# Altium footprint library ICs And Semiconductors SMD.PcbLib: 943 footprints (part 6 of 60) (continued)
## HAMAMATSU_S12642-050CN(X) [mm] "MPPC (Multi-Pixel Photon Counter), Body 13.1 x 13.1x 6.55mm"
height 6.55
Top Overlay:
  lines w0.2: -6.55,-6.55 -6.55,6.55 6.55,6.55 6.55,-6.55 -6.55,-6.55
  text "A" at -5.3,7.225 h1.2
  text "1" at -7.775,4.3 h1.2
  text "4" at -7.975,-5.3 h1.2
  text "D" at 4.3,7.225 h1.2
  text "B" at -2.1,7.225 h1.2
  text "C" at 1.1,7.225 h1.2
  text "2" at -7.975,1.1 h1.2
  text "3" at -7.975,-2.1 h1.2
Mechanical 8:
  lines w0.1: -0.5,0 0,0 ; 0,-0.5 0,0 ; 0,0.5 0,0 ; 0.5,0 0,0
Mechanical 14:
  lines w0.1: -6.55,-6.55 -6.55,6.55 6.55,6.55 6.55,-6.55 -6.55,-6.55 ; -6.3,-6.3 -6.3,-3.3 -3.3,-3.3 -3.3,-6.3 -6.3,-6.3 ; -6.3,-3.1 -6.3,-0.1 -3.3,-0.1 -3.3,-3.1 -6.3,-3.1 ; -6.3,0.1 -6.3,3.1 -3.3,3.1 -3.3,0.1 -6.3,0.1 ; -6.3,3.3 -6.3,6.3 -3.3,6.3 -3.3,3.3 -6.3,3.3 ; -3.1,-6.3 -3.1,-3.3 -0.1,-3.3 -0.1,-6.3 -3.1,-6.3 ; -3.1,-3.1 -3.1,-0.1 -0.1,-0.1 -0.1,-3.1 -3.1,-3.1 ; -3.1,0.1 -3.1,3.1 -0.1,3.1 -0.1,0.1 -3.1,0.1 ; -3.1,3.3 -3.1,6.3 -0.1,6.3 -0.1,3.3 -3.1,3.3 ; 0.1,-6.3 0.1,-3.3 3.1,-3.3 3.1,-6.3 0.1,-6.3 ; 0.1,-3.1 0.1,-0.1 3.1,-0.1 3.1,-3.1 0.1,-3.1 ; 0.1,0.1 0.1,3.1 3.1,3.1 3.1,0.1 0.1,0.1 ; 0.1,3.3 0.1,6.3 3.1,6.3 3.1,3.3 0.1,3.3 ; 3.3,-6.3 3.3,-3.3 6.3,-3.3 6.3,-6.3 3.3,-6.3 ; 3.3,-3.1 3.3,-0.1 6.3,-0.1 6.3,-3.1 3.3,-3.1 ; 3.3,0.1 3.3,3.1 6.3,3.1 6.3,0.1 3.3,0.1 ; 3.3,3.3 3.3,6.3 6.3,6.3 6.3,3.3 3.3,3.3
  text "A-1" at -5.85,4.4 h0.8
  text "B-1" at -2.65,4.4 h0.8
  text "C-1" at 0.55,4.4 h0.8
  text "D-1" at 3.75,4.4 h0.8
  text "D-2" at 3.75,1.2 h0.8
  text "C-2" at 0.55,1.2 h0.8
  text "B-2" at -2.65,1.2 h0.8
  text "A-2" at -5.85,1.2 h0.8
  text "D-3" at 3.75,-2 h0.8
  text "C-3" at 0.55,-2 h0.8
  text "B-3" at -2.65,-2 h0.8
  text "A-3" at -5.85,-2 h0.8
  text "D-4" at 3.75,-5.2 h0.8
  text "C-4" at 0.55,-5.2 h0.8
  text "B-4" at -2.65,-5.2 h0.8
  text "A-4" at -5.85,-5.2 h0.8
3D body "HAMAMATSU_S12642-050CN(X)_Part2.stp": height 5.65, standoff 5.05, extent -6.55,-6.55 6.55,6.55
3D body "HAMAMATSU_S12642-050CN(X)_Part1.stp": height 5.35, standoff 0.92, extent -6.55,-6.55 6.55,6.55

## HAMAMATSU_S12642-0404PA-50 [mm] "3x3mm2, 16 Channel (4x4) TSV MPPC (Multi-Pixel Photon Counter), Body 13.1 x 13.1x 1.55mm"
height 1.55
pads (32):
  round 0.7 smd: AA1(-4.15,4.15) AA2(-4.15,0.95) AA3(-4.15,-2.25) AA4(-4.15,-5.45) AB1(-0.95,4.15) AB2(-0.95,0.95) AB3(-0.95,-2.25) AB4(-0.95,-5.45) AC1(2.25,5.45) AC2(2.25,2.25) AC3(2.25,-0.95) AC4(2.25,-4.15) AD1(5.45,5.45) AD2(5.45,2.25) AD3(5.45,-0.95) AD4(5.45,-4.15) KA1(-5.45,5.45) KA2(-5.45,2.25) KA3(-5.45,-0.95) KA4(-5.45,-4.15) KB1(-2.25,5.45) KB2(-2.25,2.25) KB3(-2.25,-0.95) KB4(-2.25,-4.15) KC1(0.95,4.15) KC2(0.95,0.95) KC3(0.95,-2.25) KC4(0.95,-5.45) KD1(4.15,4.15) KD2(4.15,0.95) KD3(4.15,-2.25) KD4(4.15,-5.45)
Top Overlay:
  lines w0.2: -6.55,-6.55 -6.55,6.55 6.55,6.55 6.55,-6.55 -6.55,-6.55 ; 5.3,-6.3 6.3,-5.3 6.3,-6.3 5.3,-6.3
  text "A" at -5.3,7.225 h1.2
  text "1" at -7.775,4.3 h1.2
  text "4" at -7.975,-5.3 h1.2
  text "D" at 4.3,7.225 h1.2
  text "B" at -2.1,7.225 h1.2
  text "C" at 1.1,7.225 h1.2
  text "2" at -7.975,1.1 h1.2
  text "3" at -7.975,-2.1 h1.2
Mechanical 8:
  lines w0.1: -5.95,-4.15 -5.45,-4.15 ; -5.95,-0.95 -5.45,-0.95 ; -5.95,2.25 -5.45,2.25 ; -5.95,5.45 -5.45,5.45 ; -5.45,-4.65 -5.45,-4.15 ; -5.45,-3.65 -5.45,-4.15 ; -5.45,-1.45 -5.45,-0.95 ; -5.45,-0.45 -5.45,-0.95 ; -5.45,1.75 -5.45,2.25 ; -5.45,2.75 -5.45,2.25 ; -5.45,4.95 -5.45,5.45 ; -5.45,5.95 -5.45,5.45 ; -4.95,-4.15 -5.45,-4.15 ; -4.95,-0.95 -5.45,-0.95 ; -4.95,2.25 -5.45,2.25 ; -4.95,5.45 -5.45,5.45 ; -4.65,-5.45 -4.15,-5.45 ; -4.65,-2.25 -4.15,-2.25 ; -4.65,0.95 -4.15,0.95 ; -4.65,4.15 -4.15,4.15 ; -4.15,-5.95 -4.15,-5.45 ; -4.15,-4.95 -4.15,-5.45 ; -4.15,-2.75 -4.15,-2.25 ; -4.15,-1.75 -4.15,-2.25 ; -4.15,0.45 -4.15,0.95 ; -4.15,1.45 -4.15,0.95 ; -4.15,3.65 -4.15,4.15 ; -4.15,4.65 -4.15,4.15 ; -3.65,-5.45 -4.15,-5.45 ; -3.65,-2.25 -4.15,-2.25 ; -3.65,0.95 -4.15,0.95 ; -3.65,4.15 -4.15,4.15 ; -2.75,-4.15 -2.25,-4.15 ; -2.75,-0.95 -2.25,-0.95 ; -2.75,2.25 -2.25,2.25 ; -2.75,5.45 -2.25,5.45 ; -2.25,-4.65 -2.25,-4.15 ; -2.25,-3.65 -2.25,-4.15 ; -2.25,-1.45 -2.25,-0.95 ; -2.25,-0.45 -2.25,-0.95 ; -2.25,1.75 -2.25,2.25 ; -2.25,2.75 -2.25,2.25 ; -2.25,4.95 -2.25,5.45 ; -2.25,5.95 -2.25,5.45 ; -1.75,-4.15 -2.25,-4.15 ; -1.75,-0.95 -2.25,-0.95 ; -1.75,2.25 -2.25,2.25 ; -1.75,5.45 -2.25,5.45 ; -1.45,-5.45 -0.95,-5.45 ; -1.45,-2.25 -0.95,-2.25 ; -1.45,0.95 -0.95,0.95 ; -1.45,4.15 -0.95,4.15 ; -0.95,-5.95 -0.95,-5.45 ; -0.95,-4.95 -0.95,-5.45 ; -0.95,-2.75 -0.95,-2.25 ; -0.95,-1.75 -0.95,-2.25 ; -0.95,0.45 -0.95,0.95 ; -0.95,1.45 -0.95,0.95 ; -0.95,3.65 -0.95,4.15 ; -0.95,4.65 -0.95,4.15 ; -0.5,0 0,0 ; -0.45,-5.45 -0.95,-5.45 ; -0.45,-2.25 -0.95,-2.25 ; -0.45,0.95 -0.95,0.95 ; -0.45,4.15 -0.95,4.15 ; 0,-0.5 0,0 ; 0,0.5 0,0 ; 0.45,-5.45 0.95,-5.45 ; 0.45,-2.25 0.95,-2.25 ; 0.45,0.95 0.95,0.95 ; 0.45,4.15 0.95,4.15 ; 0.5,0 0,0 ; 0.95,-5.95 0.95,-5.45 ; 0.95,-4.95 0.95,-5.45 ; 0.95,-2.75 0.95,-2.25 ; 0.95,-1.75 0.95,-2.25 ; 0.95,0.45 0.95,0.95 ; 0.95,1.45 0.95,0.95 ; 0.95,3.65 0.95,4.15 ; 0.95,4.65 0.95,4.15 ; 1.45,-5.45 0.95,-5.45 ; 1.45,-2.25 0.95,-2.25 ; 1.45,0.95 0.95,0.95 ; 1.45,4.15 0.95,4.15 ; 1.75,-4.15 2.25,-4.15 ; 1.75,-0.95 2.25,-0.95 ; 1.75,2.25 2.25,2.25 ; 1.75,5.45 2.25,5.45 ; 2.25,-4.65 2.25,-4.15 ; 2.25,-3.65 2.25,-4.15 ; 2.25,-1.45 2.25,-0.95 ; 2.25,-0.45 2.25,-0.95 ; 2.25,1.75 2.25,2.25 ; 2.25,2.75 2.25,2.25 ; 2.25,4.95 2.25,5.45 ; 2.25,5.95 2.25,5.45 ; 2.75,-4.15 2.25,-4.15 ; 2.75,-0.95 2.25,-0.95 ; 2.75,2.25 2.25,2.25 ; 2.75,5.45 2.25,5.45 ; 3.65,-5.45 4.15,-5.45 ; 3.65,-2.25 4.15,-2.25 ; 3.65,0.95 4.15,0.95 ; 3.65,4.15 4.15,4.15 ; 4.15,-5.95 4.15,-5.45 ; 4.15,-4.95 4.15,-5.45 ; 4.15,-2.75 4.15,-2.25 ; 4.15,-1.75 4.15,-2.25 ; 4.15,0.45 4.15,0.95 ; 4.15,1.45 4.15,0.95 ; 4.15,3.65 4.15,4.15 ; 4.15,4.65 4.15,4.15 ; 4.65,-5.45 4.15,-5.45 ; 4.65,-2.25 4.15,-2.25 ; 4.65,0.95 4.15,0.95 ; 4.65,4.15 4.15,4.15 ; 4.95,-4.15 5.45,-4.15 ; 4.95,-0.95 5.45,-0.95 ; 4.95,2.25 5.45,2.25 ; 4.95,5.45 5.45,5.45 ; 5.45,-4.65 5.45,-4.15 ; 5.45,-3.65 5.45,-4.15 ; 5.45,-1.45 5.45,-0.95 ; 5.45,-0.45 5.45,-0.95 ; 5.45,1.75 5.45,2.25 ; 5.45,2.75 5.45,2.25 ; 5.45,4.95 5.45,5.45 ; 5.45,5.95 5.45,5.45 ; 5.95,-4.15 5.45,-4.15 ; 5.95,-0.95 5.45,-0.95 ; 5.95,2.25 5.45,2.25 ; 5.95,5.45 5.45,5.45
  text "K(B-3)" at -1.75,-0.95 h0.3
  text "A(B-3)" at -3.05,-2.25 h0.3
  text "K(B-2)" at -1.75,2.25 h0.3
  text "A(B-2)" at -3.05,0.95 h0.3
  text "K(C-3)" at 1.45,-2.25 h0.3
  text "A(C-3)" at 0.15,-0.95 h0.3
  text "K(C-2)" at 1.45,0.95 h0.3
  text "A(C-2)" at 0.15,2.25 h0.3
  text "K(B-1)" at -1.75,5.45 h0.3
  text "A(B-1)" at -3.05,4.15 h0.3
  text "K(B-4)" at -1.75,-4.15 h0.3
  text "A(B-4)" at -3.05,-5.45 h0.3
  text "K(C-4)" at 1.45,-5.45 h0.3
  text "A(C-4)" at 0.15,-4.15 h0.3
  text "K(C-1)" at 1.45,4.15 h0.3
  text "A(C-1)" at 0.15,5.45 h0.3
  text "K(D-4)" at 4.65,-5.45 h0.3
  text "A(D-4)" at 3.35,-4.15 h0.3
  text "K(D-3)" at 4.65,-2.25 h0.3
  text "A(D-3)" at 3.35,-0.95 h0.3
  text "K(A-4)" at -4.95,-4.15 h0.3
  text "A(A-4)" at -6.25,-5.45 h0.3
  text "K(A-3)" at -4.95,-0.95 h0.3
  text "A(A-3)" at -6.25,-2.25 h0.3
  text "K(A-2)" at -4.95,2.25 h0.3
  text "A(A-2)" at -6.25,0.95 h0.3
  text "K(D-2)" at 4.65,0.95 h0.3
  text "A(D-2)" at 3.35,2.25 h0.3
  text "K(A-1)" at -4.95,5.45 h0.3
  text "A(A-1)" at -6.25,4.15 h0.3
  text "K(D-1)" at 4.65,4.15 h0.3
  text "A(D-1)" at 3.35,5.45 h0.3
Mechanical 14:
  lines w0.1: -3.1,6.3 -0.1,6.3 ; 0.1,6.3 3.1,6.3 ; 6.3,-6.3 6.3,-5.3 5.3,-6.3 6.3,-6.3 ; 6.3,-6.3 3.3,-6.3 3.3,-3.3 6.3,-3.3 6.3,-6.3 ; -6.55,-6.55 -6.55,6.55 6.55,6.55 6.55,-6.55 -6.55,-6.55 ; -6.3,-6.3 -6.3,-3.3 -3.3,-3.3 -3.3,-6.3 -6.3,-6.3 ; -6.3,-3.1 -6.3,-0.1 -3.3,-0.1 -3.3,-3.1 -6.3,-3.1 ; -6.3,0.1 -6.3,3.1 -3.3,3.1 -3.3,0.1 -6.3,0.1 ; -6.3,3.3 -6.3,6.3 -3.3,6.3 -3.3,3.3 -6.3,3.3 ; -3.1,-6.3 -3.1,-3.3 -0.1,-3.3 -0.1,-6.3 -3.1,-6.3 ; -3.1,-3.1 -3.1,-0.1 -0.1,-0.1 -0.1,-3.1 -3.1,-3.1 ; -3.1,0.1 -3.1,3.1 -0.1,3.1 -0.1,0.1 -3.1,0.1 ; -3.1,3.3 -3.1,6.3 -0.1,6.3 -0.1,3.3 -3.1,3.3 ; 0.1,-6.3 0.1,-3.3 3.1,-3.3 3.1,-6.3 0.1,-6.3 ; 0.1,-3.1 0.1,-0.1 3.1,-0.1 3.1,-3.1 0.1,-3.1 ; 0.1,0.1 0.1,3.1 3.1,3.1 3.1,0.1 0.1,0.1 ; 0.1,3.3 0.1,6.3 3.1,6.3 3.1,3.3 0.1,3.3 ; 3.3,-3.1 3.3,-0.1 6.3,-0.1 6.3,-3.1 3.3,-3.1 ; 3.3,0.1 3.3,3.1 6.3,3.1 6.3,0.1 3.3,0.1 ; 3.3,3.3 3.3,6.3 6.3,6.3 6.3,3.3 3.3,3.3
3D body "HAMAMATSU_S12642-0404PA-50_Part1.stp": height 1.45, standoff 0, extent -6.55,-6.55 6.55,6.55
3D body "HAMAMATSU_S12642-0404PA-50_Part2.stp": height 1.55, standoff 1.15, extent -6.55,-6.55 6.55,6.55

## HAMAMATSU_S12642-0808PA-50 [mm] "3x3mm2, 64 Channel (8x8) TSV MPPC (Multi-Pixel Photon Counter), Body 25.8 x 25.8 x 1.55mm"
height 1.55
pads (128):
  round 0.7 smd: AA1(-10.55,10.55) AA2(-10.55,7.35) AA3(-10.55,4.15) AA4(-10.55,0.95) AA5(-10.55,-2.25) AA6(-10.55,-5.45) AA7(-10.55,-8.65) AA8(-10.55,-11.85) AB1(-7.35,10.55) AB2(-7.35,7.35) AB3(-7.35,4.15) AB4(-7.35,0.95) AB5(-7.35,-2.25) AB6(-7.35,-5.45) AB7(-7.35,-11.85) AB7(-7.35,-8.65) AC1(-4.15,11.85) AC2(-4.15,8.65) AC3(-4.15,5.45) AC4(-4.15,2.25) AC5(-4.15,-0.95) AC6(-4.15,-4.15) AC7(-4.15,-7.35) AC8(-4.15,-10.55) AD1(-0.95,11.85) AD2(-0.95,8.65) AD3(-0.95,5.45) AD4(-0.95,2.25) AD5(-0.95,-0.95) AD6(-0.95,-4.15) AD7(-0.95,-7.35) AD8(-0.95,-10.55) AE1(2.25,10.55) AE2(2.25,7.35) AE3(2.25,4.15) AE4(2.25,0.95) AE5(2.25,-2.25) AE6(2.25,-5.45) AE7(2.25,-8.65) AE8(2.25,-11.85) AF1(5.45,10.55) AF2(5.45,7.35) AF3(5.45,4.15) AF4(5.45,0.95) AF5(5.45,-2.25) AF6(5.45,-5.45) AF7(5.45,-8.65) AF8(5.45,-11.85) AG1(8.65,11.85) AG2(8.65,8.65) AG3(8.65,5.45) AG4(8.65,2.25) AG5(8.65,-0.95) AG6(8.65,-4.15) AG7(8.65,-7.35) AG8(8.65,-10.55) AH1(11.85,11.85) AH2(11.85,8.65) AH3(11.85,5.45) AH4(11.85,2.25) AH5(11.85,-0.95) AH6(11.85,-4.15) AH7(11.85,-7.35) AH8(11.85,-10.55) KA1(-11.85,11.85) KA2(-11.85,8.65) KA3(-11.85,5.45) KA4(-11.85,2.25) KA5(-11.85,-0.95) KA6(-11.85,-4.15) KA7(-11.85,-7.35) KA8(-11.85,-10.55) KB1(-8.65,11.85) KB2(-8.65,8.65) KB3(-8.65,5.45) KB4(-8.65,2.25) KB5(-8.65,-0.95) KB6(-8.65,-4.15) KB7(-8.65,-7.35) KB8(-8.65,-10.55) KC1(-5.45,10.55) KC2(-5.45,7.35) KC3(-5.45,4.15) KC4(-5.45,0.95) KC5(-5.45,-2.25) KC6(-5.45,-5.45) KC7(-5.45,-8.65) KC8(-5.45,-11.85) KD1(-2.25,10.55) KD2(-2.25,7.35) KD3(-2.25,4.15) KD4(-2.25,0.95) KD5(-2.25,-2.25) KD6(-2.25,-5.45) KD7(-2.25,-8.65) KD8(-2.25,-11.85) KE1(0.95,11.85) KE2(0.95,8.65) KE3(0.95,5.45) KE4(0.95,2.25) KE5(0.95,-0.95) KE6(0.95,-4.15) KE7(0.95,-7.35) KE8(0.95,-10.55) KF1(4.15,11.85) KF2(4.15,8.65) KF3(4.15,5.45) KF4(4.15,2.25) KF5(4.15,-0.95) KF6(4.15,-4.15) KF7(4.15,-7.35) KF8(4.15,-10.55) KG1(7.35,10.55) KG2(7.35,7.35) KG3(7.35,4.15) KG4(7.35,0.95) KG5(7.35,-2.25) KG6(7.35,-5.45) KG7(7.35,-8.65) KG8(7.35,-11.85) KH1(10.55,10.55) KH2(10.55,7.35) KH3(10.55,4.15) KH4(10.55,0.95) KH5(10.55,-2.25) KH6(10.55,-5.45) KH7(10.55,-8.65) KH8(10.55,-11.85)
Top Overlay:
  lines w0.2: 11.7,-12.7 12.7,-11.7 ; 11.7,-12.7 12.7,-12.7 ; 11.7,-12.7 12.7,-11.7 ; 11.7,-12.7 12.7,-12.7 ; 12.7,-12.7 12.7,-11.7 ; 12.7,-12.7 12.7,-11.7 ; -12.9,-12.9 12.9,-12.9 12.9,12.9 -12.9,12.9 -12.9,-12.9
  text "7" at -14.325,-8.6 h1.2
  text "6" at -14.325,-5.4 h1.2
  text "3" at -14.325,4.2 h1.2
  text "2" at -14.325,7.4 h1.2
  text "G" at 7.601,13.45 h1.2
  text "F" at 4.43,13.45 h1.2
  text "E" at 1.23,13.45 h1.2
  text "D" at -2.064,13.45 h1.2
  text "C" at -5.142,13.45 h1.2
  text "B" at -8.43,13.45 h1.2
  text "H" at 10.77,13.45 h1.2
  text "A" at -11.69,13.45 h1.2
  text "4" at -14.325,1 h1.2
  text "1" at -14.15,10.6 h1.2
  text "8" at -14.325,-11.8 h1.2
  text "5" at -14.325,-2.2 h1.2
Mechanical 8:
  drawing of 534 lines, arcs and shapes, not listed
  text "K(F-7)" at 4.475,-7.075 h0.3
  text "A(F-7)" at 3.68,-8.375 h0.3
  text "K(F-6)" at 4.475,-3.875 h0.3
  text "A(F-6)" at 3.68,-5.175 h0.3
  text "K(G-7)" at 7.675,-8.395 h0.3
  text "A(G-7)" at 6.85,-7.095 h0.3
  text "K(G-6)" at 7.675,-5.195 h0.3
  text "A(G-6)" at 6.85,-3.895 h0.3
  text "K(F-5)" at 4.475,-0.675 h0.3
  text "A(F-5)" at 3.68,-1.975 h0.3
  text "K(F-8)" at 4.475,-10.275 h0.3
  text "A(F-8)" at 3.68,-11.575 h0.3
  text "K(G-8)" at 7.675,-11.575 h0.3
  text "A(G-8)" at 6.85,-10.275 h0.3
  text "K(G-5)" at 7.675,-1.975 h0.3
  text "A(G-5)" at 6.85,-0.675 h0.3
  text "K(H-8)" at 10.875,-11.575 h0.3
  text "A(H-8)" at 10.05,-10.275 h0.3
  text "K(H-7)" at 10.875,-8.375 h0.3
  text "A(H-7)" at 10.05,-7.075 h0.3
  text "K(E-8)" at 1.275,-10.275 h0.3
  text "A(E-8)" at 0.48,-11.575 h0.3
  text "K(E-7)" at 1.275,-7.075 h0.3
  text "A(E-7)" at 0.48,-8.375 h0.3
  text "K(E-6)" at 1.275,-3.875 h0.3
  text "A(E-6)" at 0.48,-5.175 h0.3
  text "K(H-6)" at 10.875,-5.175 h0.3
  text "A(H-6)" at 10.05,-3.875 h0.3
  text "K(E-5)" at 1.275,-0.675 h0.3
  text "A(E-5)" at 0.48,-1.975 h0.3
  text "K(H-5)" at 10.875,-1.975 h0.3
  text "A(H-5)" at 10.05,-0.675 h0.3
  text "K(F-3)" at 4.475,5.725 h0.3
  text "A(F-3)" at 3.68,4.425 h0.3
  text "K(F-2)" at 4.475,8.925 h0.3
  text "A(F-2)" at 3.68,7.625 h0.3
  text "K(G-3)" at 7.675,4.405 h0.3
  text "A(G-3)" at 6.85,5.705 h0.3
  text "K(G-2)" at 7.675,7.605 h0.3
  text "A(G-2)" at 6.85,8.905 h0.3
  text "K(F-1)" at 4.475,12.125 h0.3
  text "A(F-1)" at 3.74,10.825 h0.3
  text "K(F-4)" at 4.475,2.525 h0.3
  text "A(F-4)" at 3.65,1.225 h0.3
  text "K(G-4)" at 7.675,1.225 h0.3
  text "A(G-4)" at 6.82,2.525 h0.3
  text "K(G-1)" at 7.675,10.825 h0.3
  text "A(G-1)" at 6.91,12.125 h0.3
  text "K(H-4)" at 10.875,1.225 h0.3
  text "A(H-4)" at 10.02,2.525 h0.3
  text "K(H-3)" at 10.875,4.425 h0.3
  text "A(H-3)" at 10.05,5.725 h0.3
  text "K(E-4)" at 1.275,2.525 h0.3
  text "A(E-4)" at 0.45,1.225 h0.3
  text "K(E-3)" at 1.275,5.725 h0.3
  text "A(E-3)" at 0.48,4.425 h0.3
  text "K(E-2)" at 1.275,8.925 h0.3
  text "A(E-2)" at 0.48,7.625 h0.3
  text "K(H-2)" at 10.875,7.625 h0.3
  text "A(H-2)" at 10.05,8.925 h0.3
  text "K(E-1)" at 1.275,12.125 h0.3
  text "A(E-1)" at 0.54,10.825 h0.3
  text "K(H-1)" at 10.875,10.825 h0.3
  text "A(H-1)" at 10.11,12.125 h0.3
  text "K(B-3)" at -8.325,5.725 h0.3
  text "A(B-3)" at -9.15,4.425 h0.3
  text "K(B-2)" at -8.325,8.925 h0.3
  text "A(B-2)" at -9.15,7.625 h0.3
  text "K(C-3)" at -5.125,4.405 h0.3
  text "A(C-3)" at -5.92,5.705 h0.3
  text "K(C-2)" at -5.125,7.605 h0.3
  text "A(C-2)" at -5.92,8.905 h0.3
  text "K(B-1)" at -8.325,12.125 h0.3
  text "A(B-1)" at -9.09,10.825 h0.3
  text "K(B-4)" at -8.325,2.525 h0.3
  text "A(B-4)" at -9.18,1.225 h0.3
  text "K(C-4)" at -5.125,1.225 h0.3
  text "A(C-4)" at -5.95,2.525 h0.3
  text "K(C-1)" at -5.125,10.825 h0.3
  text "A(C-1)" at -5.86,12.125 h0.3
  text "K(D-4)" at -1.925,1.225 h0.3
  text "A(D-4)" at -2.78,2.525 h0.3
  text "K(D-3)" at -1.925,4.425 h0.3
  text "A(D-3)" at -2.75,5.725 h0.3
  text "K(A-4)" at -11.525,2.525 h0.3
  text "A(A-4)" at -12.41,1.225 h0.3
  text "K(A-3)" at -11.525,5.725 h0.3
  text "A(A-3)" at -12.38,4.425 h0.3
  text "K(A-2)" at -11.525,8.925 h0.3
  text "A(A-2)" at -12.38,7.625 h0.3
  text "K(D-2)" at -1.925,7.625 h0.3
  text "A(D-2)" at -2.75,8.925 h0.3
  text "K(A-1)" at -11.525,12.125 h0.3
  text "A(A-1)" at -12.32,10.825 h0.3
  text "K(D-1)" at -1.925,10.825 h0.3
  text "A(D-1)" at -2.69,12.125 h0.3
  text "K(B-7)" at -8.325,-7.075 h0.3
  text "A(B-7)" at -9.15,-8.375 h0.3
  text "K(B-6)" at -8.325,-3.875 h0.3
  text "A(B-6)" at -9.15,-5.175 h0.3
  text "K(C-7)" at -5.125,-8.395 h0.3
  text "A(C-7)" at -5.92,-7.095 h0.3
  text "K(C-6)" at -5.125,-5.195 h0.3
  text "A(C-6)" at -5.92,-3.895 h0.3
  text "K(B-5)" at -8.325,-0.675 h0.3
  text "A(B-5)" at -9.15,-1.975 h0.3
  text "K(B-8)" at -8.325,-10.275 h0.3
  text "A(B-8)" at -9.15,-11.575 h0.3
  text "K(C-8)" at -5.125,-11.575 h0.3
  text "A(C-8)" at -5.92,-10.275 h0.3
  text "K(C-5)" at -5.125,-1.975 h0.3
  text "A(C-5)" at -5.92,-0.675 h0.3
  text "K(D-8)" at -1.925,-11.575 h0.3
  text "A(D-8)" at -2.75,-10.275 h0.3
  text "K(D-7)" at -1.925,-8.375 h0.3
  text "A(D-7)" at -2.75,-7.075 h0.3
  text "K(A-8)" at -11.525,-10.275 h0.3
  text "A(A-8)" at -12.38,-11.575 h0.3
  text "K(A-7)" at -11.525,-7.075 h0.3
  text "A(A-7)" at -12.38,-8.375 h0.3
  text "K(A-6)" at -11.525,-3.875 h0.3
  text "A(A-6)" at -12.38,-5.175 h0.3
  text "K(D-6)" at -1.925,-5.175 h0.3
  text "A(D-6)" at -2.75,-3.875 h0.3
  text "K(A-5)" at -11.525,-0.675 h0.3
  text "A(A-5)" at -12.38,-1.975 h0.3
  text "K(D-5)" at -1.925,-1.975 h0.3
  text "A(D-5)" at -2.75,-0.675 h0.3
Mechanical 14:
  drawing of 264 lines, arcs and shapes, not listed
  text "7" at -14.325,-8.6 h1.2
  text "6" at -14.325,-5.4 h1.2
  text "3" at -14.325,4.2 h1.2
  text "2" at -14.325,7.4 h1.2
  text "G" at 7.601,13.45 h1.2
  text "F" at 4.43,13.45 h1.2
  text "E" at 1.23,13.45 h1.2
  text "D" at -2.064,13.45 h1.2
  text "C" at -5.142,13.45 h1.2
  text "B" at -8.43,13.45 h1.2
  text "H" at 10.77,13.45 h1.2
  text "A" at -11.69,13.45 h1.2
  text "4" at -14.325,1 h1.2
  text "1" at -14.15,10.6 h1.2
  text "8" at -14.325,-11.8 h1.2
  text "5" at -14.325,-2.2 h1.2
3D body "HAMAMATSU_S12642-0808PA-50_Part2.stp": height 1.55, standoff 1.15, extent -12.9,-12.9 12.9,12.9
3D body "HAMAMATSU_S12642-0808PA-50_Part1.stp": height 1.45, standoff 0, extent -12.9,-12.9 12.9,12.9

## HAMAMATSU_S12642-0808PB-50 [mm] "3x3mm2, 64 Channel (8x8) TSV MPPC (Multi-Pixel Photon Counter), Body 25.8 x 25.8 x 1.45mm"
height 5.45
Top Overlay:
  lines w0.2: -12.9,-12.9 -12.9,12.9 12.9,12.9 12.9,-12.9 -12.9,-12.9 ; -12.1,-12.1 -12.1,-11.6 -11.6,-11.6 -11.6,-12.1 -12.1,-12.1 ; -12.1,11.6 -11.6,11.6 -11.6,12.1 -12.1,12.1 -12.1,11.6 ; 11.6,-12.1 12.1,-12.1 12.1,-11.6 11.6,-11.6 11.6,-12.1
  text "2" at -6.85,-0.6 h1.2
  text "1" at 3.776,-0.5 h1.2
  text "7" at -14.325,-8.6 h1.2
  text "6" at -14.325,-5.4 h1.2
  text "3" at -14.325,4.2 h1.2
  text "2" at -14.325,7.4 h1.2
  text "G" at 7.601,13.45 h1.2
  text "F" at 4.43,13.45 h1.2
  text "E" at 1.23,13.45 h1.2
  text "D" at -2.064,13.45 h1.2
  text "C" at -5.142,13.45 h1.2
  text "B" at -8.43,13.45 h1.2
  text "H" at 10.77,13.45 h1.2
  text "A" at -11.69,13.45 h1.2
  text "4" at -14.325,1 h1.2
  text "1" at -14.15,10.6 h1.2
  text "8" at -14.325,-11.8 h1.2
  text "5" at -14.325,-2.2 h1.2
Mechanical 8:
  drawing of 572 lines, arcs and shapes, not listed
  text "A(D-5)" at -2.575,-1.1 h0.3
  text "K(D-5)" at -1.75,-2.4 h0.3
  text "A(A-5)" at -12.205,-2.4 h0.3
  text "K(A-5)" at -11.35,-1.1 h0.3
  text "A(D-6)" at -2.575,-4.3 h0.3
  text "K(D-6)" at -1.75,-5.6 h0.3
  text "A(A-6)" at -12.205,-5.6 h0.3
  text "K(A-6)" at -11.35,-4.3 h0.3
  text "A(A-7)" at -12.205,-8.8 h0.3
  text "K(A-7)" at -11.35,-7.5 h0.3
  text "A(A-8)" at -12.205,-12 h0.3
  text "K(A-8)" at -11.35,-10.7 h0.3
  text "A(D-7)" at -2.575,-7.5 h0.3
  text "K(D-7)" at -1.75,-8.8 h0.3
  text "A(D-8)" at -2.575,-10.7 h0.3
  text "K(D-8)" at -1.75,-12 h0.3
  text "A(C-5)" at -5.745,-1.1 h0.3
  text "K(C-5)" at -4.95,-2.4 h0.3
  text "A(C-8)" at -5.745,-10.7 h0.3
  text "K(C-8)" at -4.95,-12 h0.3
  text "A(B-8)" at -8.975,-12 h0.3
  text "K(B-8)" at -8.15,-10.7 h0.3
  text "A(B-5)" at -8.975,-2.4 h0.3
  text "K(B-5)" at -8.15,-1.1 h0.3
  text "A(C-6)" at -5.745,-4.32 h0.3
  text "K(C-6)" at -4.95,-5.62 h0.3
  text "A(C-7)" at -5.745,-7.52 h0.3
  text "K(C-7)" at -4.95,-8.82 h0.3
  text "A(B-6)" at -8.975,-5.6 h0.3
  text "K(B-6)" at -8.15,-4.3 h0.3
  text "A(B-7)" at -8.975,-8.8 h0.3
  text "K(B-7)" at -8.15,-7.5 h0.3
  text "A(D-1)" at -2.515,11.7 h0.3
  text "K(D-1)" at -1.75,10.4 h0.3
  text "A(A-1)" at -12.145,10.4 h0.3
  text "K(A-1)" at -11.35,11.7 h0.3
  text "A(D-2)" at -2.575,8.5 h0.3
  text "K(D-2)" at -1.75,7.2 h0.3
  text "A(A-2)" at -12.205,7.2 h0.3
  text "K(A-2)" at -11.35,8.5 h0.3
  text "A(A-3)" at -12.205,4 h0.3
  text "K(A-3)" at -11.35,5.3 h0.3
  text "A(A-4)" at -12.235,0.8 h0.3
  text "K(A-4)" at -11.35,2.1 h0.3
  text "A(D-3)" at -2.575,5.3 h0.3
  text "K(D-3)" at -1.75,4 h0.3
  text "A(D-4)" at -2.605,2.1 h0.3
  text "K(D-4)" at -1.75,0.8 h0.3
  text "A(C-1)" at -5.685,11.7 h0.3
  text "K(C-1)" at -4.95,10.4 h0.3
  text "A(C-4)" at -5.775,2.1 h0.3
  text "K(C-4)" at -4.95,0.8 h0.3
  text "A(B-4)" at -9.005,0.8 h0.3
  text "K(B-4)" at -8.15,2.1 h0.3
  text "A(B-1)" at -8.915,10.4 h0.3
  text "K(B-1)" at -8.15,11.7 h0.3
  text "A(C-2)" at -5.745,8.48 h0.3
  text "K(C-2)" at -4.95,7.18 h0.3
  text "A(C-3)" at -5.745,5.28 h0.3
  text "K(C-3)" at -4.95,3.98 h0.3
  text "A(B-2)" at -8.975,7.2 h0.3
  text "K(B-2)" at -8.15,8.5 h0.3
  text "A(B-3)" at -8.975,4 h0.3
  text "K(B-3)" at -8.15,5.3 h0.3
  text "A(H-1)" at 10.285,11.7 h0.3
  text "K(H-1)" at 11.05,10.4 h0.3
  text "A(E-1)" at 0.715,10.4 h0.3
  text "K(E-1)" at 1.45,11.7 h0.3
  text "A(H-2)" at 10.225,8.5 h0.3
  text "K(H-2)" at 11.05,7.2 h0.3
  text "A(E-2)" at 0.655,7.2 h0.3
  text "K(E-2)" at 1.45,8.5 h0.3
  text "A(E-3)" at 0.655,4 h0.3
  text "K(E-3)" at 1.45,5.3 h0.3
  text "A(E-4)" at 0.625,0.8 h0.3
  text "K(E-4)" at 1.45,2.1 h0.3
  text "A(H-3)" at 10.225,5.3 h0.3
  text "K(H-3)" at 11.05,4 h0.3
  text "A(H-4)" at 10.195,2.1 h0.3
  text "K(H-4)" at 11.05,0.8 h0.3
  text "A(G-1)" at 7.085,11.7 h0.3
  text "K(G-1)" at 7.85,10.4 h0.3
  text "A(G-4)" at 6.995,2.1 h0.3
  text "K(G-4)" at 7.85,0.8 h0.3
  text "A(F-4)" at 3.825,0.8 h0.3
  text "K(F-4)" at 4.65,2.1 h0.3
  text "A(F-1)" at 3.915,10.4 h0.3
  text "K(F-1)" at 4.65,11.7 h0.3
  text "A(G-2)" at 7.025,8.48 h0.3
  text "K(G-2)" at 7.85,7.18 h0.3
  text "A(G-3)" at 7.025,5.28 h0.3
  text "K(G-3)" at 7.85,3.98 h0.3
  text "A(F-2)" at 3.855,7.2 h0.3
  text "K(F-2)" at 4.65,8.5 h0.3
  text "A(F-3)" at 3.855,4 h0.3
  text "K(F-3)" at 4.65,5.3 h0.3
  text "A(H-5)" at 10.225,-1.1 h0.3
  text "K(H-5)" at 11.05,-2.4 h0.3
  text "A(E-5)" at 0.655,-2.4 h0.3
  text "K(E-5)" at 1.45,-1.1 h0.3
  text "A(H-6)" at 10.225,-4.3 h0.3
  text "K(H-6)" at 11.05,-5.6 h0.3
  text "A(E-6)" at 0.655,-5.6 h0.3
  text "K(E-6)" at 1.45,-4.3 h0.3
  text "A(E-7)" at 0.655,-8.8 h0.3
  text "K(E-7)" at 1.45,-7.5 h0.3
  text "A(E-8)" at 0.655,-12 h0.3
  text "K(E-8)" at 1.45,-10.7 h0.3
  text "A(H-7)" at 10.225,-7.5 h0.3
  text "K(H-7)" at 11.05,-8.8 h0.3
  text "A(H-8)" at 10.225,-10.7 h0.3
  text "K(H-8)" at 11.05,-12 h0.3
  text "A(G-5)" at 7.025,-1.1 h0.3
  text "K(G-5)" at 7.85,-2.4 h0.3
  text "A(G-8)" at 7.025,-10.7 h0.3
  text "K(G-8)" at 7.85,-12 h0.3
  text "A(F-8)" at 3.855,-12 h0.3
  text "K(F-8)" at 4.65,-10.7 h0.3
  text "A(F-5)" at 3.855,-2.4 h0.3
  text "K(F-5)" at 4.65,-1.1 h0.3
  text "A(G-6)" at 7.025,-4.32 h0.3
  text "K(G-6)" at 7.85,-5.62 h0.3
  text "A(G-7)" at 7.025,-7.52 h0.3
  text "K(G-7)" at 7.85,-8.82 h0.3
  text "A(F-6)" at 3.855,-5.6 h0.3
  text "K(F-6)" at 4.65,-4.3 h0.3
  text "A(F-7)" at 3.855,-8.8 h0.3
  text "K(F-7)" at 4.65,-7.5 h0.3
Mechanical 14:
  drawing of 373 lines, arcs and shapes, not listed
  text "2" at -6.85,-0.6 h1.2
  text "1" at 3.776,-0.5 h1.2
  text "7" at -14.325,-8.6 h1.2
  text "6" at -14.325,-5.4 h1.2
  text "3" at -14.325,4.2 h1.2
  text "2" at -14.325,7.4 h1.2
  text "G" at 7.601,13.45 h1.2
  text "F" at 4.43,13.45 h1.2
  text "E" at 1.23,13.45 h1.2
  text "D" at -2.064,13.45 h1.2
  text "C" at -5.142,13.45 h1.2
  text "B" at -8.43,13.45 h1.2
  text "H" at 10.77,13.45 h1.2
  text "A" at -11.69,13.45 h1.2
  text "4" at -14.325,1 h1.2
  text "1" at -14.15,10.6 h1.2
  text "8" at -14.325,-11.8 h1.2
  text "5" at -14.325,-2.2 h1.2
3D body "HAMAMATSU_S12642-0808PB-50_Part1.stp": height 5.35, standoff 0.92, extent -12.9,-12.9 12.9,12.9
3D body "HAMAMATSU_S12642-0808PB-50_Part2.stp": height 5.45, standoff 5.05, extent -12.9,-12.9 12.9,12.9

## HAMAMATSU_S12643-050CN(X) [mm] "MPPC (Multi-Pixel Photon Counter), Body 13.1 x 13.1x 6.55mm"
height 6.55
Top Overlay:
  lines w0.2: -7.15,-7.15 7.15,-7.15 7.15,7.15 -7.15,7.15 -7.15,-7.15
  text "A" at -5.3,7.725 h1.2
  text "1" at -8.275,4.3 h1.2
  text "4" at -8.475,-5.3 h1.2
  text "D" at 4.3,7.725 h1.2
  text "B" at -2.1,7.725 h1.2
  text "C" at 1.1,7.725 h1.2
  text "2" at -8.475,1.1 h1.2
  text "3" at -8.475,-2.1 h1.2
Mechanical 8:
  lines w0.1: -0.5,0 0,0 ; 0,-0.5 0,0 ; 0,0.5 0,0 ; 0.5,0 0,0
Mechanical 14:
  lines w0.1: -7.15,-7.15 7.15,-7.15 7.15,7.15 -7.15,7.15 -7.15,-7.15 ; -6.9,-6.9 -3.9,-6.9 -3.9,-3.9 -6.9,-3.9 -6.9,-6.9 ; -6.9,-3.3 -3.9,-3.3 -3.9,-0.3 -6.9,-0.3 -6.9,-3.3 ; -6.9,0.3 -3.9,0.3 -3.9,3.3 -6.9,3.3 -6.9,0.3 ; -6.9,3.9 -3.9,3.9 -3.9,6.9 -6.9,6.9 -6.9,3.9 ; -3.3,-6.9 -0.3,-6.9 -0.3,-3.9 -3.3,-3.9 -3.3,-6.9 ; -3.3,-3.3 -0.3,-3.3 -0.3,-0.3 -3.3,-0.3 -3.3,-3.3 ; -3.3,0.3 -0.3,0.3 -0.3,3.3 -3.3,3.3 -3.3,0.3 ; -3.3,3.9 -0.3,3.9 -0.3,6.9 -3.3,6.9 -3.3,3.9 ; 0.3,-6.9 3.3,-6.9 3.3,-3.9 0.3,-3.9 0.3,-6.9 ; 0.3,-3.3 3.3,-3.3 3.3,-0.3 0.3,-0.3 0.3,-3.3 ; 0.3,0.3 3.3,0.3 3.3,3.3 0.3,3.3 0.3,0.3 ; 0.3,3.9 3.3,3.9 3.3,6.9 0.3,6.9 0.3,3.9 ; 3.9,-6.9 6.9,-6.9 6.9,-3.9 3.9,-3.9 3.9,-6.9 ; 3.9,-3.3 6.9,-3.3 6.9,-0.3 3.9,-0.3 3.9,-3.3 ; 3.9,0.3 6.9,0.3 6.9,3.3 3.9,3.3 3.9,0.3 ; 3.9,3.9 6.9,3.9 6.9,6.9 3.9,6.9 3.9,3.9
  text "A-4" at -6.45,-5.8 h0.8
  text "B-4" at -2.85,-5.8 h0.8
  text "C-4" at 0.75,-5.8 h0.8
  text "D-4" at 4.35,-5.8 h0.8
  text "A-3" at -6.45,-2.2 h0.8
  text "B-3" at -2.85,-2.2 h0.8
  text "C-3" at 0.75,-2.2 h0.8
  text "D-3" at 4.35,-2.2 h0.8
  text "A-2" at -6.45,1.4 h0.8
  text "B-2" at -2.85,1.4 h0.8
  text "C-2" at 0.75,1.4 h0.8
  text "D-2" at 4.35,1.4 h0.8
  text "D-1" at 4.35,5 h0.8
  text "C-1" at 0.75,5 h0.8
  text "B-1" at -2.85,5 h0.8
  text "A-1" at -6.45,5 h0.8
3D body "HAMAMATSU_S12643-050CN(X)_Part2.stp": height 5.75, standoff 5.15, extent -7.15,-7.15 7.15,7.15
3D body "HAMAMATSU_S12643-050CN(X)_Part1.stp": height 5.45, standoff 0.92, extent -7.15,-7.15 7.15,7.15